# Altium footprint library 2.07-SOT封装.PcbLib: 45 footprints (part 2 of 3)
Each footprint in its own frame and in the unit in brackets; x right, y up, seen from the top. Pads: shape width x height; smd on the part's side, far side on the other; paste and mask are expansions set on the pad; w line width, h text height; cw(c..) or ccw(c..) is an arc to the next point about the centre after c.
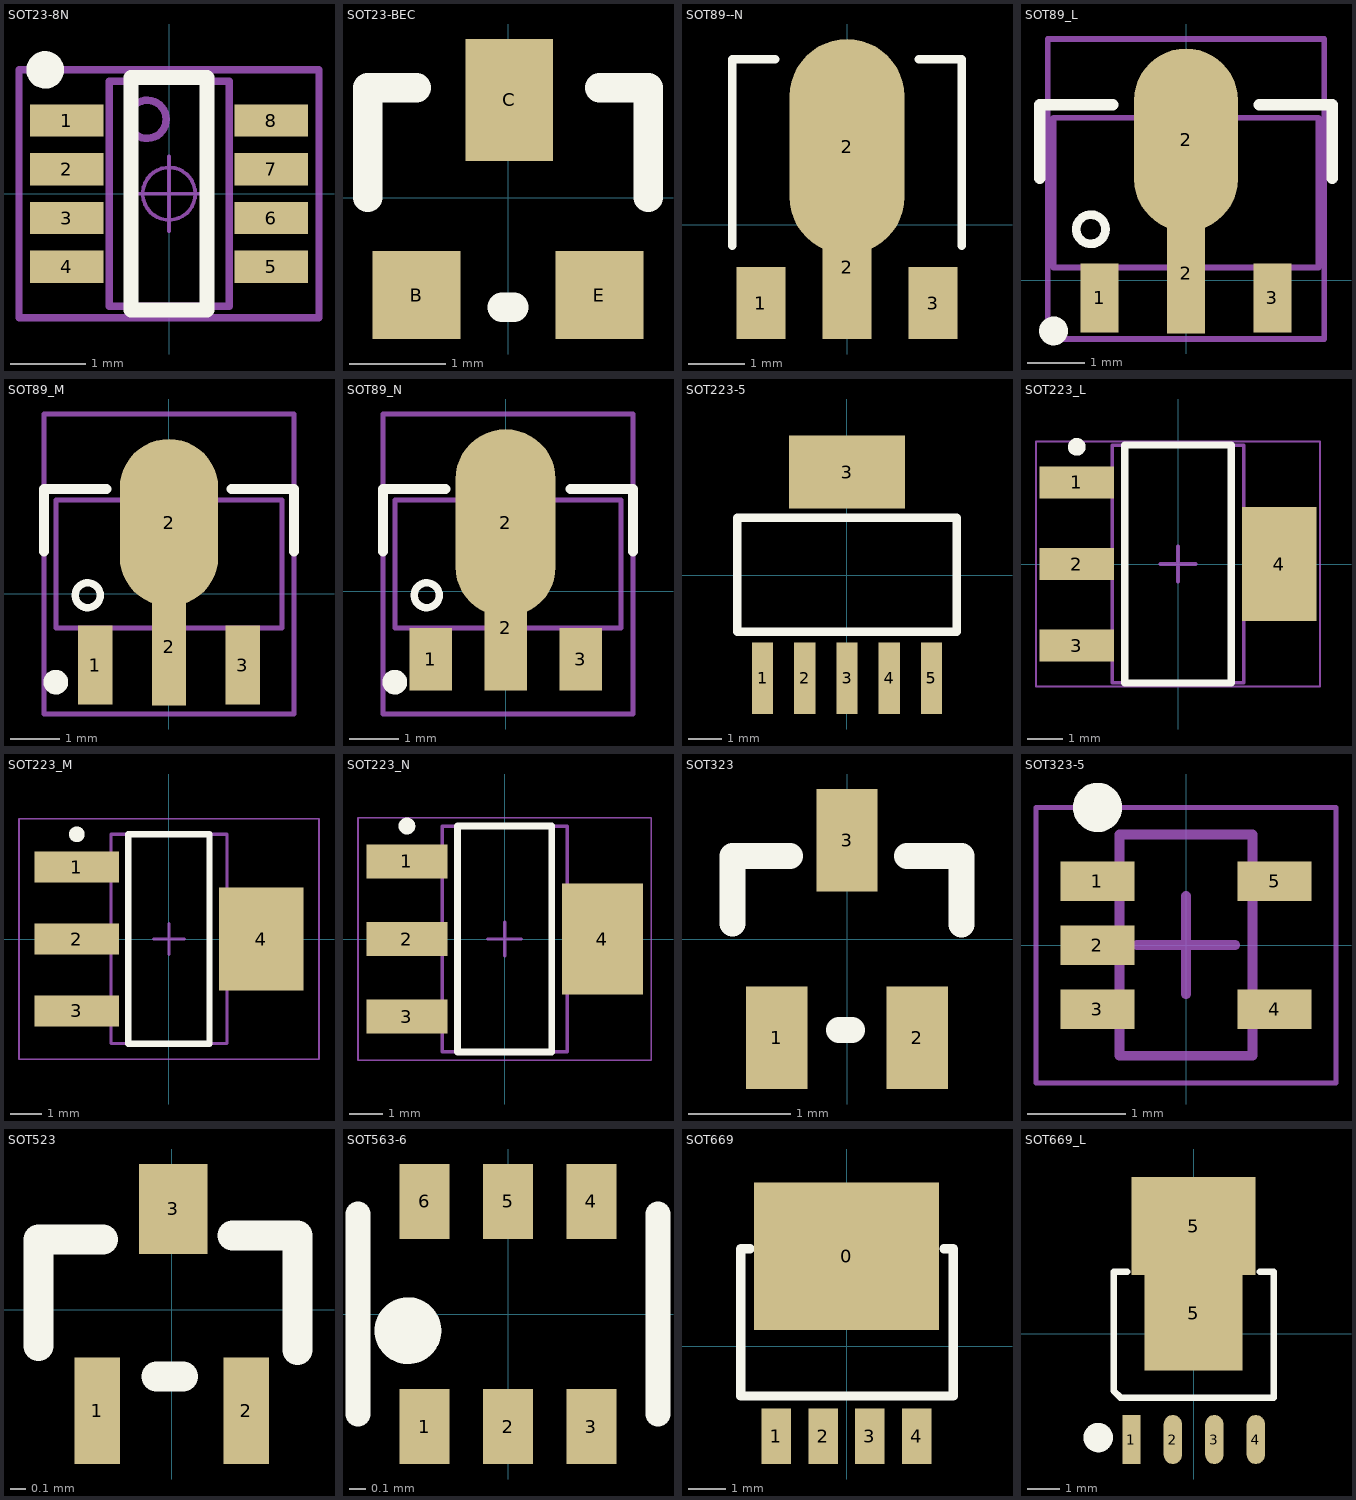
[diagram p1: the footprints below, top view; thin cyan lines are the x and y axes]

## SOT23-8N [mil] "SOT23, 8-Leads, Body 2.9x1.75mm, Pitch 0.65mm.      [ PCBѧϰȺ514746572 ]"
pads (8):
  rect 38.5x17 smd paste+0: 1(-53.75,38.39) 2(-53.75,12.8) 3(-53.75,-12.8) 4(-53.75,-38.39) 5(53.75,-38.39) 6(53.75,-12.8) 7(53.75,12.8) 8(53.75,38.39)
Top Overlay:
  circle w9.84: c-64.99,64.99 r4.92
  lines w7.87: -19.99,-61.04 -19.99,61.01 20.01,61.01 20.01,-61.04 -19.99,-61.04
Mechanical 13:
  circle w3.94: c-11.49,39.04 r10
  lines w3.94: -31.48,-59.06 31.51,-59.06 31.51,59.05 -31.48,59.05 -31.48,-59.06
Mechanical 15:
  circle w1.97: c0.01,-0.01 r13.78
  lines w1.97: -19.68,-0.01 19.69,-0.01 ; 0.01,-19.7 0.01,19.67
  lines w3.94: -78.74,-65.01 78.74,-65.01 78.74,64.99 -78.74,64.99 -78.74,-65.01
3D body "SOT23-8.STEP": height 47.28, standoff 2, extent -55.24,-59.05 55.26,59.06

## SOT23-BEC [mil] "[ PCBѧϰȺ514746572 ]"
pads (3):
  rect 36x36 smd: B(-37.5,-40) E(37.5,-40)
  rect 36x50 smd: C(0.5,40)
Top Overlay:
  lines w12: -57.5,0 -57.5,45 -37.5,45 ; -2.5,-45 2.5,-45 ; 37.5,45 57.5,45 57.5,0
3D body "SOT23-3-2.STEP": height 41.34, standoff 0, extent -60.61,-47.24 57.5,47.24

## SOT89--N [mil] "[ PCBѧϰȺ514746572 ]"
pads (4):
  rect 34.02x50 smd: 1(-60,-54.47) 3(60,-54.47)
  rect 34x100 smd: 2(0,-29.47)
  oval 80x150 smd: 2(0,54.47)
Top Overlay:
  lines w5.91: -80,-14.47 -80,115.53 -50,115.53 ; 50,115.53 80,115.53 80,-14.47
3D body "SW3dPS-SOT89.STEP": height 62.57, standoff -0.76, extent -90.55,-71.12 90.55,96.2

## SOT89_L [mm] "4.6x4.3x1.6mm(长宽高)      [ PCB学习群514746572 ]"
height 1.6
pads (4):
  rect 0.66x1.2 smd: 1(-1.5,-0.303) 3(1.5,-0.303)
  rect 0.66x2.1 smd: 2(0,0.127)
  oval 1.8x3.175 smd: 2(0,2.441)
Top Overlay:
  circle w0.15: c-1.651,0.889 r0.254
  circle w0.25: c-2.3,-0.876 r0.125
  lines w0.2: -2.54,1.778 -2.54,3.048 -1.27,3.048 ; 1.27,3.048 2.54,3.048 2.54,1.778
Mechanical 13:
  circle w0.1: c-1.651,0.889 r0.25
  lines w0.1: -2.3,0.224 -2.3,2.824 2.3,2.824 2.3,0.224 -2.3,0.224
Mechanical 15:
  circle w0.05: c0,1.524 r0.35
  lines w0.05: -0.5,1.524 0.5,1.524 ; 0,1.024 0,2.024
  lines w0.1: -2.4,-1.016 -2.4,4.191 2.4,4.191 2.4,-1.016 -2.4,-1.016
3D body "SOT89.STEP": height 1.6, standoff 0.04, extent -2.3,-0.825 2.3,3.475

## SOT89_M [mm] "4.6x4.3x1.6mm(长宽高)      [ PCB学习群514746572 ]"
height 1.6
pads (4):
  rect 0.7x1.6 smd: 1(-1.5,-1.448) 3(1.5,-1.448)
  rect 0.7x2.4 smd: 2(0,-1.071)
  oval 2x3.4 smd: 2(0,1.448)
Top Overlay:
  circle w0.25: c-2.3,-1.794 r0.125
  circle w0.15: c-1.651,-0.029 r0.254
  lines w0.2: -2.54,0.86 -2.54,2.13 -1.27,2.13 ; 1.27,2.13 2.54,2.13 2.54,0.86
Mechanical 13:
  circle w0.1: c-1.651,-0.029 r0.25
  lines w0.1: -2.3,-0.694 2.3,-0.694 2.3,1.906 -2.3,1.906 -2.3,-0.694
Mechanical 15:
  circle w0.05: c0,0.606 r0.35
  lines w0.05: -0.5,0.606 0.5,0.606 ; 0,0.106 0,1.106
  lines w0.1: -2.54,-2.442 -2.54,3.654 2.54,3.654 2.54,-2.442 -2.54,-2.442
3D body "SOT89.STEP": height 1.6, standoff 0.04, extent -2.275,-1.775 2.325,2.525

## SOT89_N [mil] "4.6x4.3x1.6mm(长宽高)      [ PCB学习群514746572 ]"
height 62.99
pads (4):
  rect 34.02x50 smd: 1(-60,-54.47) 3(60,-54.47)
  rect 34x100 smd: 2(0,-29.47)
  oval 80x150 smd: 2(0,54.47)
Top Overlay:
  circle w5.91: c-63.03,-3.35 r10
  circle w9.84: c-88.58,-72.84 r4.92
  lines w7.87: -98.03,31.65 -98.03,81.65 -48.03,81.65 ; 51.97,81.65 101.97,81.65 101.97,31.65
Mechanical 13:
  circle w3.94: c-63.03,-3.35 r9.84
  lines w3.94: -88.58,-29.53 -88.58,72.83 92.52,72.83 92.52,-29.53 -88.58,-29.53
Mechanical 15:
  circle w1.97: c1.97,21.65 r13.78
  lines w1.97: -17.72,21.65 21.65,21.65 ; 1.97,1.97 1.97,41.34
  lines w3.94: -98.03,-98.35 101.97,-98.35 101.97,141.65 -98.03,141.65 -98.03,-98.35
3D body "SOT89.STEP": height 62.99, standoff 1.57, extent -88.58,-72.83 92.52,96.46

## SOT223-5 [mm] "[ PCBѧϰȺ514746572 ]"
pads (6):
  rect 0.635x2.15 smd: 1(-2.54,-3.1) 2(-1.27,-3.1) 3(0,-3.1) 4(1.27,-3.1) 5(2.54,-3.1)
  rect 3.5x2.2 smd: 3(0,3.1)
Top Overlay:
  lines w0.254: -3.3,-1.7 3.3,-1.7 3.3,1.73 -3.3,1.73 -3.3,-1.7
3D body "SOT223-5.STEP": height 1.9, standoff -0.17, extent -3.275,-3.608 3.275,3.652

## SOT223_L [mm] "SOT223, 4-Leads, Body 6.5x3.5mm, Pitch 2.3mm, Lead Span 7mm, IPC High Density      [ PCBѧϰȺ514746572 ]"
height 1.8
pads (4):
  rect 2.1x0.9 smd: 1(-2.85,2.3) 2(-2.85,0) 3(-2.85,-2.3)
  rect 2.1x3.2 smd: 4(2.85,0)
Top Overlay:
  circle w0.25: c-2.85,3.3 r0.125
  lines w0.2: -1.5,-3.35 1.5,-3.35 1.5,3.35 -1.5,3.35 -1.5,-3.35
Mechanical 13:
  lines w0.1: -1.855,-3.35 1.855,-3.35 1.855,3.35 -1.855,3.35 -1.855,-3.35
Mechanical 15:
  lines w0.05: -4,-3.45 4,-3.45 4,3.45 -4,3.45 -4,-3.45
  lines w0.1: -0.5,0 0.5,0 ; 0,-0.5 0,0.5
3D body "SOT223.STEP": height 1.65, standoff -0.02, extent -3.508,-3.25 3.508,3.25

## SOT223_M [mm] "SOT223, 4-Leads, Body 6.5x3.5mm, Pitch 2.3mm, Lead Span 7mm, IPC Low Density      [ PCBѧϰȺ514746572 ]"
height 1.8
pads (4):
  rect 2.7x1 smd: 1(-2.95,2.3) 2(-2.95,0) 3(-2.95,-2.3)
  rect 2.7x3.3 smd: 4(2.95,0)
Top Overlay:
  circle w0.25: c-2.95,3.35 r0.125
  lines w0.2: -1.3,-3.35 -1.3,3.35 1.3,3.35 1.3,-3.35 -1.3,-3.35
Mechanical 13:
  lines w0.1: -1.855,-3.35 -1.855,3.35 1.855,3.35 1.855,-3.35 -1.855,-3.35
Mechanical 15:
  lines w0.05: -4.8,-3.85 -4.8,3.85 4.8,3.85 4.8,-3.85 -4.8,-3.85
  lines w0.1: -0.5,0 0.5,0 ; 0,-0.5 0,0.5
3D body "SOT223.STEP": height 1.65, standoff -0.02, extent -3.558,-3.3 3.458,3.2

## SOT223_N [mm] "SOT223, 4-Leads, Body 6.5x3.5mm, Pitch 2.3mm, Lead Span 7mm, IPC Medium Density      [ PCBѧϰȺ514746572 ]"
height 1.8
pads (4):
  rect 2.4x1 smd: 1(-2.9,2.3) 2(-2.9,0) 3(-2.9,-2.3)
  rect 2.4x3.3 smd: 4(2.9,0)
Top Overlay:
  circle w0.25: c-2.9,3.35 r0.125
  lines w0.2: -1.4,-3.35 -1.4,3.35 1.4,3.35 1.4,-3.35 -1.4,-3.35
Mechanical 13:
  lines w0.1: -1.855,-3.35 -1.855,3.35 1.855,3.35 1.855,-3.35 -1.855,-3.35
Mechanical 15:
  lines w0.05: -4.35,-3.6 -4.35,3.6 4.35,3.6 4.35,-3.6 -4.35,-3.6
  lines w0.1: -0.5,0 0.5,0 ; 0,-0.5 0,0.5
3D body "SOT223.STEP": height 1.65, standoff -0.02, extent -3.558,-3.3 3.458,3.2

## SOT323 [mm] "[ PCBѧϰȺ514746572 ]"
pads (3):
  rect 0.6x1 smd: 1(-0.686,-0.965) 2(0.686,-0.965) 3(0,0.965)
Top Overlay:
  lines w0.254: -1.118,0.152 -1.118,0.813 -0.559,0.813 ; -0.076,-0.889 0.051,-0.889 ; 0.584,0.813 1.118,0.813 1.118,0.143
3D body "SOT323_sc70-3.STEP": height 1.1, standoff 0, extent -1.15,-1.072 1.05,1.173

## SOT323-5 [mm] "SOT23, 5-Leads, Body 2x1.25mm, Pitch 0.65mm, IPC Medium Density      [ PCBѧϰȺ514746572 ]"
height 1.1
pads (5):
  rect 0.75x0.4 smd: 1(-0.9,0.65) 2(-0.9,0) 3(-0.9,-0.65) 4(0.9,-0.65) 5(0.9,0.65)
Top Overlay:
  circle w0.25: c-0.9,1.4 r0.125
Mechanical 13:
  lines w0.1: -0.675,-1.125 -0.675,1.125 0.675,1.125 0.675,-1.125 -0.675,-1.125
Mechanical 15:
  lines w0.05: -1.525,-1.4 -1.525,1.4 1.525,1.4 1.525,-1.4 -1.525,-1.4
  lines w0.1: -0.5,0 0.5,0 ; 0,-0.5 0,0.5
3D body "sot353.step": height 1, standoff 0, extent -1.15,-1.05 1.15,1.05

## SOT523 [mil] "[ PCBѧϰȺ514746572 ]"
pads (3):
  rect 12x28 smd: 1(-19.58,-26.48) 2(19.58,-26.48)
  rect 18x23.62 smd: 3(0.46,26.48)
Top Overlay:
  lines w7.87: -35,-9.5 -35,18.5 -18,18.5 ; -4,-17.5 3,-17.5 ; 16,19.5 33,19.5 33,-10.5
3D body "SOT-523.step": height 31.5, standoff 0, extent -31.5,-33 31.49,29.99

## SOT563-6 [mm] "[ PCBѧϰȺ514746572 ]"
pads (6):
  rect 0.3x0.45 smd: 1(-0.5,-0.675) 2(0,-0.675) 3(0.5,-0.675) 4(0.5,0.675) 5(0,0.675) 6(-0.5,0.675)
Top Overlay:
  circle w0.2: c-0.6,-0.1 r0.1
  lines w0.15: -0.9,-0.6 -0.9,0.6 ; 0.9,-0.6 0.9,0.6
3D body "SW3dPS-SOT-563.STEP": height 0.58, standoff 0, extent -0.8,-0.8 0.8,0.826

## SOT669 [mm] "IFPAK      [ PCBѧϰȺ514746572 ]"
pads (5):
  rect 5x4 smd: 0(0,2.438)
  rect 0.8x1.5 smd: 1(-1.905,-2.438) 2(-0.635,-2.438) 3(0.635,-2.438) 4(1.905,-2.438)
Top Overlay:
  lines w0.254: -2.616,2.642 -2.87,2.642 -2.87,-1.346 2.896,-1.346 2.896,2.642 2.642,2.642
3D body "SOT669.STEP": height 1.1, standoff -0.01, extent -2.457,-2.587 2.443,3.534

## SOT669_L [mm] "6mm*4.9mm*1mm(长*宽*高）      [ PCB学习群514746572 ]"
pads (6):
  rect 0.559x1.5 smd: 1(-1.905,-3.234)
  oval 0.559x1.5 smd: 2(-0.635,-3.234) 3(0.635,-3.234) 4(1.905,-3.234)
  rect 3x3.5 smd: 5(0,0.635)
  rect 3.8x3 smd: 5(0,3.302)
Top Overlay:
  circle w0.5: c-2.921,-3.175 r0.2
  lines w0.203: -2.032,1.905 -2.45,1.905 -2.45,-1.741 -2.241,-1.95 2.45,-1.95 2.45,1.905 2.032,1.905
Mechanical 15:
  circle w0.05: c0,0 r0.35
  lines w0.05: -0.5,0 0.5,0 ; 0,-0.5 0,0.5
3D body "SOT669.STEP": height 1.1, standoff -0.01, extent -2.475,-3.521 2.425,2.6